# Altium footprint library AltiumDesignerLibraries.PcbLib: 313 footprints (part 4 of 20)
Each footprint in its own frame and in the unit in brackets; x right, y up, seen from the top. Pads: shape width x height; smd on the part's side, far side on the other; paste and mask are expansions set on the pad; w line width, h text height; cw(c..) or ccw(c..) is an arc to the next point about the centre after c.
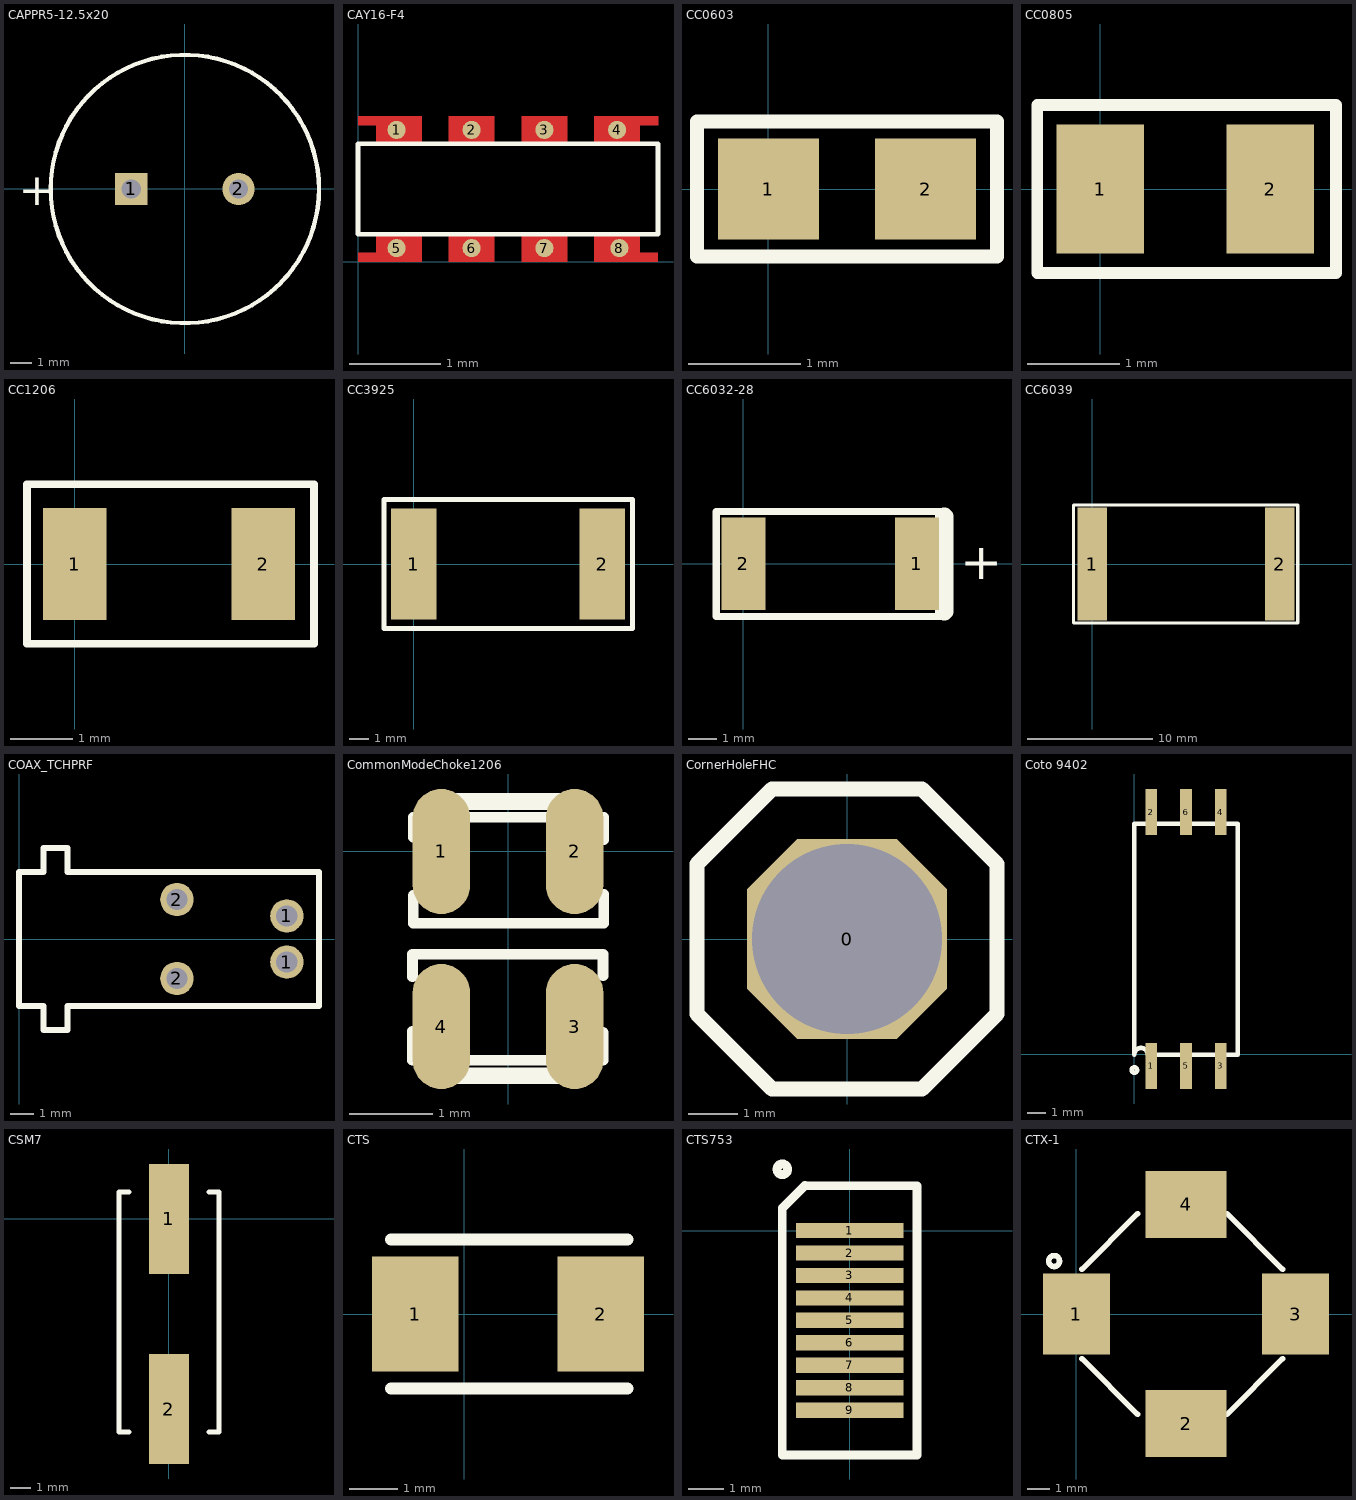
[diagram p3: the footprints below, top view; thin cyan lines are the x and y axes]

## CAPPR5-12.5x20 [mm]
height 20
pads (2):
  rect 1.5x1.5 hole 0.9: 1(-2.5,0)
  round 1.5 hole 0.9: 2(2.5,0)
Top Overlay:
  circle w0.2: c0,0 r6.25
  text "+" at -7.725,-0.75 h1.5

## CAY16-F4 [mm]
height 0.5
pads (8):
  round 0.2 smd paste+0 mask+0: 1(0.425,1.45) 2(1.25,1.45) 3(2.05,1.45) 4(2.85,1.45) 5(0.425,0.15) 6(1.25,0.15) 7(2.05,0.15) 8(2.875,0.15)
Top Layer:
  region: 2.3,0 2.3,0.3 1.8,0.3 1.8,0
  region: 1.5,1.3 1.5,1.6 1,1.6 1,1.3
  region: 1.5,0 1.5,0.3 1,0.3 1,0
  region: 2.3,1.3 2.3,1.6 1.8,1.6 1.8,1.3
  region: 0,1.6 0.7,1.6 0.7,1.3 0.2,1.3 0.2,1.5 0,1.5
  region: 3.3,1.6 2.6,1.6 2.6,1.3 3.1,1.3 3.1,1.5 3.3,1.5
  region: 0,0 0.7,0 0.7,0.3 0.2,0.3 0.2,0.1 0,0.1
  region: 3.3,0 2.6,0 2.6,0.3 3.1,0.3 3.1,0.1 3.3,0.1
Top Overlay:
  lines w0.05: 0,0.3 3.3,0.3 3.3,1.3 0,1.3 0,0.3

## CC0603 [mm]
pads (2):
  rect 0.9x0.9 smd: 1(0,0) 2(1.4,0)
Top Overlay:
  lines w0.127: -0.635,-0.6 -0.635,0.6 2.035,0.6 2.035,-0.6 -0.635,-0.6

## CC0805 [mm]
pads (2):
  rect 0.95x1.4 smd: 1(0,0) 2(1.849,0)
Top Overlay:
  lines w0.127: -0.686,-0.914 2.565,-0.914 2.565,0.914 -0.686,0.914 -0.686,-0.914

## CC1206 [mil]
pads (2):
  rect 40x70 smd: 1(0,0) 2(118.1,0)
Top Overlay:
  lines w5: -30,-50 150,-50 150,50 -30,50 -30,-50

## CC3925 [mm]
pads (2):
  rect 2.35x5.7 smd: 1(0,0) 2(9.64,0)
Top Overlay:
  lines w0.254: -1.524,-3.302 11.176,-3.302 11.176,3.302 10.922,3.302 -1.524,3.302 -1.524,3.048 -1.524,-3.302

## CC6032-28 [mil]
pads (2):
  rect 60x126 smd: 1(236,0) 2(0,0)
Top Overlay:
  lines w10: -36.64,68.9 -36.64,-71.85 273.4,-71.85 ; -36.64,70.87 273.4,70.87
  lines w25: 273.4,-64.96 273.4,63.98
  text "+" at 295,-21 h50

## CC6039 [mm]
pads (2):
  rect 2.35x9 smd: 1(0,0) 2(14.95,0)
Top Overlay:
  lines w0.254: -1.5,-4.7 -1.5,3.4 -1.5,4.7 16.4,4.7 16.4,-4.7 -1.5,-4.7

## COAX_TCHPRF [mil]
pads (4):
  round 55 hole 35: 1(441,-38) 1(441,38) 2(260,-65) 2(260,65)
Top Overlay:
  lines w10: 0,-110 40,-110 40,-150 80,-150 80,-110 494,-110 494,110 80,110 80,150 40,150 40,110 0,110 0,-110

## CommonModeChoke1206 [mm] "Four contact common mode choke pakage 1206 size"
pads (4):
  oval 0.69x1.5 smd: 1(-0.8,0) 2(0.8,0) 3(0.8,-2.1) 4(-0.8,-2.1)
Top Overlay:
  lines w0.127: -1.146,-2.158 -1.146,-2.504 1.14,-2.504 1.14,-2.172 ; -1.146,-1.504 -1.146,-1.234 1.14,-1.234 1.14,-1.49 ; -1.136,-0.528 -1.136,-0.86 1.15,-0.86 1.15,-0.514 ; -1.136,0.172 -1.136,0.41 1.15,0.41 1.15,0.14
  lines w0.2: -0.8,-2.69 0.8,-2.69 ; -0.8,0.6 0.8,0.6

## CornerHoleFHC [mil]
pads (1):
  oct 160x160 hole 152: 0(0,0)
Top Overlay:
  lines w12: -120,-60 -120,60 -60,120 0,120 60,120 120,60 120,-60 60,-120 0,-120 -60,-120 -120,-60

## Coto 9402 [mil]
pads (6):
  rect 25x100 smd: 1(37,-25) 2(37,525) 3(187,-25) 4(187,525) 5(112,-25) 6(112,525)
Top Overlay:
  circle w9.84: c0.09,-34 r5.91
  lines w9.84: -0.5,-0.5 -0.5,499.5 224.5,499.5 224.5,-0.5 30.4,-0.5 ; 0.06,-0.5 cw(c14.5,-0.5) 28.94,-0.5

## CSM7 [mm]
pads (2):
  rect 2x5.5 smd: 1(0,0) 2(0,-9.5)
Top Overlay:
  lines w0.254: -2,-10.64 -2.5,-10.64 -2.5,1.36 -2,1.36 ; 2,-10.64 2.5,-10.64 2.5,1.36 2,1.36

## CTS [mil] "Two terminal crystal footprint"
height 0.05
pads (2):
  rect 71x94 smd: 1(-40,0) 2(112,0)
Top Overlay:
  lines w10: -60,-61 134,-61 ; -60,61 134,61

## CTS753 [mil]
pads (9):
  rect 120x17 smd: 1(0,0) 2(0,-25) 3(0,-50) 4(0,-75) 5(0,-100) 6(0,-125) 7(0,-150) 8(0,-175) 9(0,-200)
Top Overlay:
  circle w9.84: c-75,68.31 r5.91
  lines w9.84: -75,25 -75,-250 75,-250 75,50 -50,50
  lines w10: -75,25 -50,50

## CTX-1 [mm]
pads (4):
  rect 3.05x3.68 smd: 1(0,0) 3(9.996,0)
  rect 3.68x3.05 smd: 2(4.998,-4.998) 4(4.998,4.998)
Top Overlay:
  circle w0.25: c-1.016,2.413 r0.25
  lines w0.25: 0.254,-2.032 2.794,-4.572 ; 0.254,2.032 2.794,4.572 ; 6.858,-4.572 9.398,-2.032 ; 6.858,4.572 9.398,2.032